# Altium footprint library lamp_controller.PcbLib: 67 footprints (part 1 of 5)
Each footprint in its own frame and in the unit in brackets; x right, y up, seen from the top. Pads: shape width x height; smd on the part's side, far side on the other; paste and mask are expansions set on the pad; w line width, h text height; cw(c..) or ccw(c..) is an arc to the next point about the centre after c.
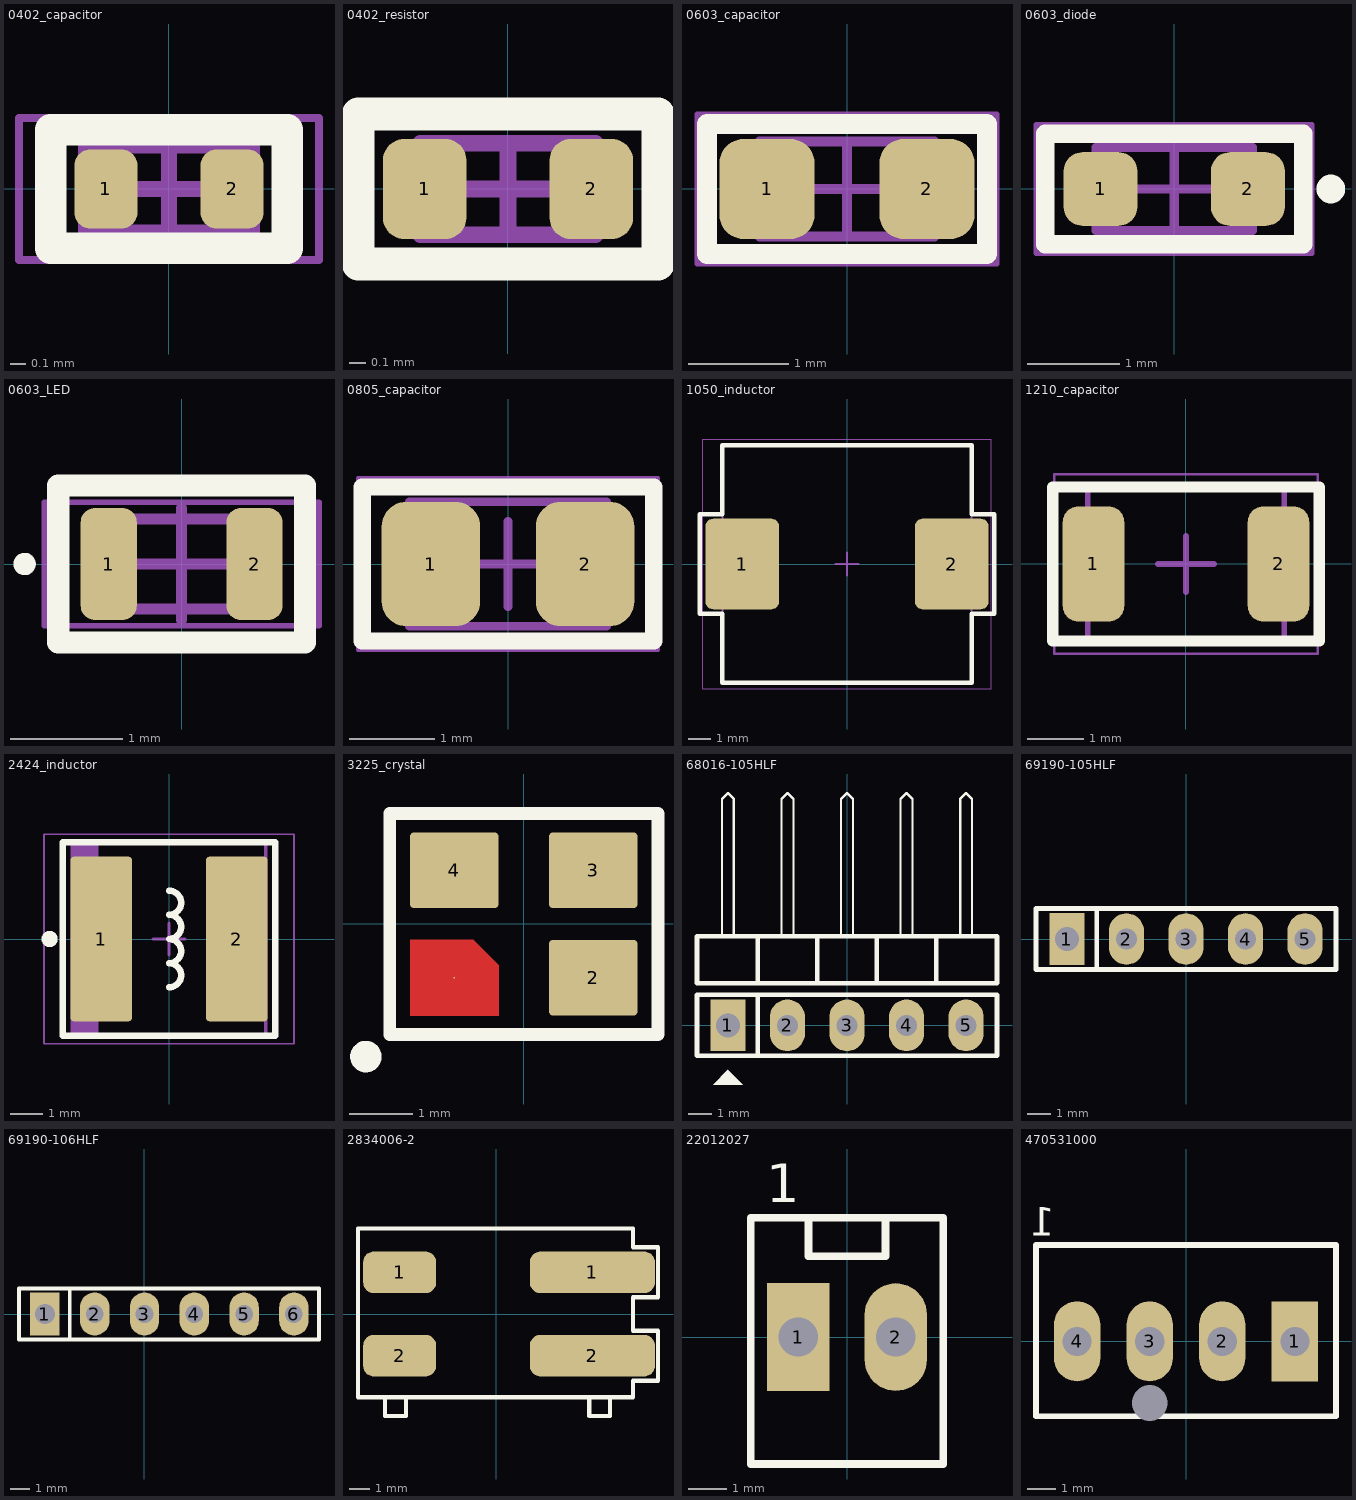
[diagram p0: the footprints below, top view; thin cyan lines are the x and y axes]

## 0402_capacitor [mm] "0402 chip capacitor"
height 0.55
pads (2):
  rrect50% 0.4x0.5 smd: 1(-0.4,0) 2(0.4,0)
Top Overlay:
  lines w0.2: -0.75,-0.375 0.75,-0.375 0.75,0.375 -0.75,0.375 -0.75,-0.375
Mechanical 13:
  lines w0.1: -0.525,-0.275 -0.525,0.275 0.525,0.275 0.525,-0.275 -0.525,-0.275
Mechanical 15:
  lines w0.05: -0.95,-0.45 -0.95,0.45 0.95,0.45 0.95,-0.45 -0.95,-0.45
  lines w0.1: -0.275,0 0.275,0 ; 0,-0.275 0,0.275
3D body "0402_capacitor.step": height 0.55, standoff 0, extent -0.525,-0.275 0.525,0.275

## 0402_resistor [mm] "Chip Resistor, 2-Leads, Body 1.00x0.50mm, IPC Medium Density"
height 0.4
pads (2):
  rrect50% 0.5x0.6 smd: 1(-0.5,0) 2(0.5,0)
Top Overlay:
  lines w0.2: -0.9,-0.45 0.9,-0.45 0.9,0.45 -0.9,0.45 -0.9,-0.45
Mechanical 13:
  lines w0.1: -0.525,-0.275 -0.525,0.275 0.525,0.275 0.525,-0.275 -0.525,-0.275
Mechanical 15:
  lines w0.05: -0.9,-0.45 -0.9,0.45 0.9,0.45 0.9,-0.45 -0.9,-0.45
  lines w0.1: -0.275,0 0.275,0 ; 0,-0.275 0,0.275
3D body "0402_resistor_fix.step": height 0.4, standoff 0, extent -0.525,-0.275 0.525,0.275

## 0603_capacitor [mm] "Chip Capacitor, 2-Leads, Body 1.60x0.80mm, IPC Medium Density"
height 0.87
pads (2):
  rrect50% 0.95x1 smd: 1(-0.8,0) 2(0.8,0)
Top Overlay:
  lines w0.2: -1.4,-0.65 1.4,-0.65 1.4,0.65 -1.4,0.65 -1.4,-0.65
Mechanical 13:
  lines w0.1: -0.875,-0.475 -0.875,0.475 0.875,0.475 0.875,-0.475 -0.875,-0.475
Mechanical 15:
  lines w0.05: -1.5,-0.75 -1.5,0.75 1.5,0.75 1.5,-0.75 -1.5,-0.75
  lines w0.1: -0.475,0 0.475,0 ; 0,-0.475 0,0.475
3D body "0603_capacitor.step": height 0.87, standoff 0, extent -0.875,-0.475 0.875,0.475

## 0603_diode [mm]
height 0.8
pads (2):
  rrect50% 0.8x0.8 smd: 1(-0.8,0) 2(0.8,0)
Top Overlay:
  circle w0.2: c1.7,0 r0.056
  lines w0.2: -1.4,-0.6 1.4,-0.6 1.4,0.6 -1.4,0.6 -1.4,-0.6
Mechanical 13:
  lines w0.1: -0.85,-0.45 -0.85,0.45 0.85,0.45 0.85,-0.45 -0.85,-0.45
Mechanical 15:
  lines w0.05: -1.5,-0.7 -1.5,0.7 1.5,0.7 1.5,-0.7 -1.5,-0.7
  lines w0.1: -0.45,0 0.45,0 ; 0,-0.45 0,0.45
3D body "0603_led.step": height 0.7, standoff 0, extent -0.8,-0.4 0.8,0.4

## 0603_LED [mm] "SODFL, 2-Leads, Body 0.80x1.60mm, IPC Medium Density"
height 0.4
pads (2):
  rrect50% 0.5x1 smd: 1(-0.65,0) 2(0.65,0)
Top Overlay:
  circle w0.1: c-1.4,0 r0.05
  lines w0.2: -1.1,-0.7 -1.1,0.7 1.1,0.7 1.1,-0.7 -1.1,-0.7
Top Courtyard:
  lines w0.05: -1.225,-0.55 1.225,-0.55 1.225,0.55 -1.225,0.55 -1.225,-0.55
  lines w0.1: -0.5,0 0.5,0 ; 0,-0.5 0,0.5
Mechanical 13:
  lines w0.1: -0.8,-0.4 0.8,-0.4 0.8,0.4 -0.8,0.4 -0.8,-0.4
3D body "xl-1608uwc-04_led.step": height 0.41, standoff 0.01, extent -0.8,-0.4 0.8,0.4

## 0805_capacitor [mm] "Chip Capacitor, 2-Leads, Body 2.00x1.25mm, IPC Medium Density"
height 0.95
pads (2):
  rrect50% 1.15x1.45 smd: 1(-0.9,0) 2(0.9,0)
Top Overlay:
  lines w0.2: -1.7,-0.9 1.7,-0.9 1.7,0.9 -1.7,0.9 -1.7,-0.9
Mechanical 13:
  lines w0.1: -1.15,-0.725 -1.15,0.725 1.15,0.725 1.15,-0.725 -1.15,-0.725
Mechanical 15:
  lines w0.05: -1.75,-1 -1.75,1 1.75,1 1.75,-1 -1.75,-1
  lines w0.1: -0.5,0 0.5,0 ; 0,-0.5 0,0.5
3D body "0805_capacitor.step": height 0.95, standoff 0, extent -1.15,-0.725 1.15,0.725

## 1050_inductor [mm] "Precision Wire Wound Inductor, 2-Leads, Body 11.00x10.50mm, IPC Medium Density"
height 5
pads (2):
  rrect20% 3.25x4 smd: 1(-4.625,0) 2(4.625,0)
Top Overlay:
  lines w0.2: -6.5,-2.2 -5.5,-2.2 -5.5,-5.25 5.5,-5.25 5.5,-2.2 6.5,-2.2 6.5,2.2 5.5,2.2 5.5,5.25 -5.5,5.25 -5.5,2.2 -6.5,2.2 -6.5,-2.2
Top Courtyard:
  lines w0.05: -6.375,-5.5 6.375,-5.5 6.375,5.5 -6.375,5.5 -6.375,-5.5
  lines w0.1: -0.5,0 0.5,0 ; 0,-0.5 0,0.5
Mechanical 13:
  lines w0.1: -5.5,-5.25 5.5,-5.25 5.5,5.25 -5.5,5.25 -5.5,-5.25
3D body "1050_inductor.step": height 5.1, standoff 0, extent -5.6,-5.25 5.6,5.25

## 1210_capacitor [mm] "1210 chip capacitor"
height 2.7
pads (2):
  rrect50% 1.1x2.05 smd: 1(-1.65,0) 2(1.65,0)
Top Overlay:
  lines w0.2: -2.375,-1.375 -2.375,1.375 2.375,1.375 2.375,-1.375 -2.375,-1.375
Mechanical 13:
  lines w0.1: -1.75,-1.35 1.75,-1.35 1.75,1.35 -1.75,1.35 -1.75,-1.35
Mechanical 15:
  lines w0.05: -2.35,-1.6 2.35,-1.6 2.35,1.6 -2.35,1.6 -2.35,-1.6
  lines w0.1: -0.5,0 0.5,0 ; 0,-0.5 0,0.5
3D body "CAP1210.step": height 2.7, standoff 0, extent -1.75,-1.35 1.75,1.35

## 2424_inductor [mm] "Precision Wire Wound Inductor, 2-Leads, Body 6.00x6.00mm, IPC Medium Density"
height 4.5
pads (2):
  rrect10% 1.9x5.1 smd: 1(-2.1,0) 2(2.1,0)
Top Overlay:
  circle w0.25: c-3.7,0 r0.125
  lines w0.2: 0,-1.5 ccw(c0,-1.125) 0,-0.75 ccw(c0,-0.375) 0,0 ccw(c0,0.375) 0,0.75 ccw(c0,1.125) 0,1.5 ; -3.3,-3 -3.3,3 3.3,3 3.3,-3 -3.3,-3
Top Courtyard:
  lines w0.05: -3.875,-3.25 3.875,-3.25 3.875,3.25 -3.875,3.25 -3.875,-3.25
  lines w0.1: -0.5,0 0.5,0 ; 0,-0.5 0,0.5
Mechanical 13:
  rectangle: -3,-3 -2.193,3
  lines w0.1: -3,-3 3,-3 3,3 -3,3 -3,-3
3D body "vls6045ex-6r8m_inductor.step": height 4.51, standoff 0.01, extent -3,-3 3,3

## 3225_crystal [mm]
pads (4):
  round 0.025 smd: 1(-1.1,-0.85)
  rrect10% 1.4x1.2 smd: 2(1.1,-0.85) 3(1.1,0.85) 4(-1.1,0.85)
Top Layer:
  region: -1.8,-1.45 -1.8,-0.25 -1.4,-0.25 -0.8,-0.25 -0.4,-0.65 -0.4,-1.45
Top Overlay:
  circle w0.25: c-2.5,-2.1 r0.125
  lines w0.2: -2.125,-1.75 -2.125,1.75 2.125,1.75 2.125,-1.75 -2.125,-1.75
3D body: height 0.8, standoff 0, extent -1.6,-1.25 1.6,1.25

## 68016-105HLF [mm] "5-pin 0.1\" header, right angle"
pads (5):
  rect 1.5x2.2 hole 1.02: 1(-5.08,0)
  oval 1.5x2.2 hole 0.9: 2(-2.54,0) 3(0,0) 4(2.54,0) 5(5.08,0)
Top Overlay:
  region: -5.715,-2.54 -5.08,-1.905 -4.445,-2.54
  lines w0.1: -5.334,3.81 -5.334,9.652 -5.08,9.906 -4.826,9.652 -4.826,3.81 ; -2.794,3.81 -2.794,9.652 -2.54,9.906 -2.286,9.652 -2.286,3.81 ; -0.254,3.81 -0.254,9.652 0,9.906 0.254,9.652 0.254,3.81 ; 2.286,3.81 2.286,9.652 2.54,9.906 2.794,9.652 2.794,3.81 ; 4.826,3.81 4.826,9.652 5.08,9.906 5.334,9.652 5.334,3.81
  lines w0.2: -3.81,-1.27 -3.81,1.3 ; -3.81,1.905 -3.81,3.683 ; -1.27,1.905 -1.27,3.683 ; 1.27,1.905 1.27,3.683 ; 3.81,1.905 3.81,3.683 ; -6.4,-1.3 -6.4,1.3 6.4,1.3 6.4,-1.3 -6.4,-1.3 ; -6.4,1.8 6.4,1.8 6.4,3.8 -6.4,3.8 -6.4,1.8
3D body "68016-105HLF.STEP": height 2.51, standoff -2.95, extent -6.35,-0.31 6.35,9.91

## 69190-105HLF [mm] "5-pin 0.1\" header"
pads (5):
  rect 1.5x2.2 hole 1.02: 1(-5.08,0)
  oval 1.5x2.2 hole 0.9: 2(-2.54,0) 3(0,0) 4(2.54,0) 5(5.08,0)
Top Overlay:
  lines w0.2: -3.81,-1.27 -3.81,1.3 ; -6.4,-1.3 -6.4,1.3 6.4,1.3 6.4,-1.3 -6.4,-1.3
3D body "69190-105hlf_connector.step": height 8.39, standoff -3.04, extent -6.35,-1.205 6.35,1.205

## 69190-106HLF [mm] "6-pin 0.1\" header"
pads (6):
  rect 1.5x2.2 hole 1.02: 1(-5.08,0)
  oval 1.5x2.2 hole 0.9: 2(-2.54,0) 3(0,0) 4(2.54,0) 5(5.08,0) 6(7.62,0)
Top Overlay:
  lines w0.2: -3.81,-1.27 -3.81,1.3 ; -6.4,-1.3 -6.4,1.3 8.9,1.3 8.9,-1.3 -6.4,-1.3

## 2834006-2 [mm] "2-Pin spring clamp terminal"
pads (4):
  rrect50% 3.5x2 smd: 1(-4.625,2) 2(-4.625,-2)
  rrect50% 6x2 smd: 1(4.625,2) 2(4.625,-2)
Top Overlay:
  lines w0.2: -5.325,-4.1 -5.325,-4.9 -4.325,-4.9 -4.325,-4.1 ; 4.475,-4 4.475,-4.9 5.475,-4.9 5.475,-4 ; -6.625,-4 6.575,-4 6.575,-3.2 7.775,-3.2 7.775,-0.8 6.575,-0.8 6.575,0.8 7.775,0.8 7.775,3.2 6.575,3.2 6.575,4.1 -6.625,4.1 -6.625,-4
3D body "2834006-2_wire_connector.step": height 4.49, standoff 0.01, extent -6.325,-4.9 7.518,4.05

## 22012027 [mm]
pads (2):
  rect 1.62x2.8 hole 1.02: 1(-1.27,0)
  oval 1.62x2.8 hole 1.02: 2(1.27,0)
Top Overlay:
  lines w0.2: -1,3.1 -1,2.1 1,2.1 1,3.1 ; -2.5,-3.3 -2.5,3.1 2.5,3.1 2.5,-3.3 -2.5,-3.3
  text "1" at -2.1,3.5 h1
3D body "22232021_0.1_header.step": height 10.68, standoff -3.54, extent -2.464,-3.251 2.464,3.099

## 470531000 [mm]
pads (5):
  rect 1.62x2.8 hole 1.02: 1(3.81,0)
  oval 1.62x2.8 hole 1.02: 2(1.27,0) 3(-1.27,0) 4(-3.81,0)
  rect 0x0 hole 1.25 unplated: ""(-1.27,-2.16)
Top Overlay:
  lines w0.2: -5.25,-2.625 -5.25,3.375 5.25,3.375 5.25,-2.625 -5.25,-2.625
  text "1" at -4.6,3.7 h1
3D body "470531000.sldprt": height 10, standoff -3.5, extent -5.1,-2.54 5.1,3.3